# Altium footprint library TarabusLib_KOR.PcbLib: 560 footprints (part 6 of 35)
Each footprint in its own frame and in the unit in brackets; x right, y up, seen from the top. Pads: shape width x height; smd on the part's side, far side on the other; paste and mask are expansions set on the pad; w line width, h text height; cw(c..) or ccw(c..) is an arc to the next point about the centre after c.
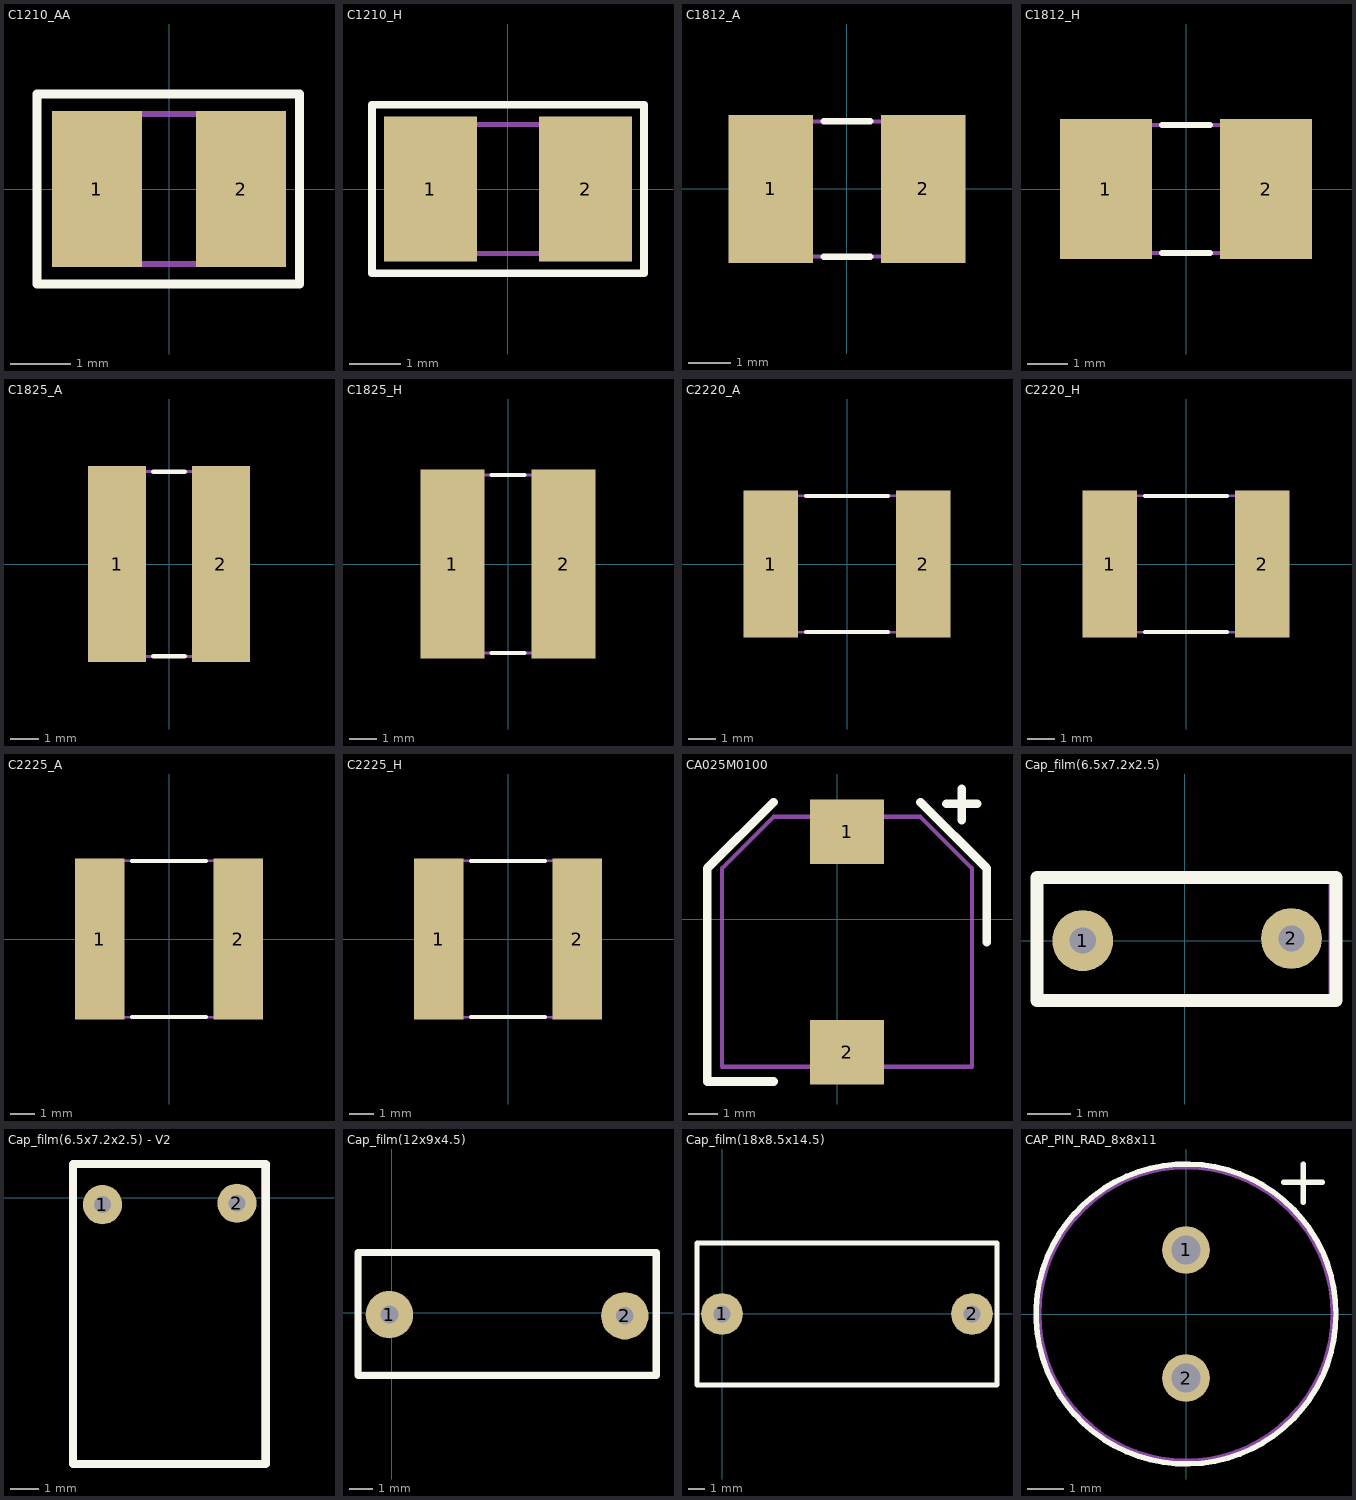
[diagram p5: the footprints below, top view; thin cyan lines are the x and y axes]

## C1210_AA [mm]
height 2.5
pads (2):
  rect 1.5x2.6 smd: 1(-1.2,0) 2(1.2,0)
Top Overlay:
  lines w0.15: -2.2,-1.58 -2.2,1.58 2.175,1.58 2.175,-1.58 -2.2,-1.58
Mechanical 7:
  lines w0.1: -1.6,-1.25 1.6,-1.25 1.6,1.25 -1.6,1.25 -1.6,-1.25
Mechanical 10:
  text ".Designator" at -0.71,1.89 h0.8
  text ".Comment" at -0.74,-2.23 h0.6
3D body: height 2.5, standoff 0, extent -1.6,-1.25 1.6,1.25

## C1210_H [mm]
height 2.5
pads (2):
  rect 1.8x2.8 smd: 1(-1.5,0) 2(1.5,0)
Top Overlay:
  lines w0.15: -2.63,-1.63 -2.63,1.63 2.63,1.63 2.63,-1.63 -2.63,-1.63
Mechanical 7:
  lines w0.1: -1.6,-1.25 1.6,-1.25 1.6,1.25 -1.6,1.25 -1.6,-1.25
Mechanical 10:
  text ".Designator" at -0.71,1.89 h0.8
  text ".Comment" at -0.69,-2.29 h0.6
3D body: height 2.5, standoff 0, extent -1.6,-1.25 1.6,1.25

## C1812_A [mm]
height 1.7
pads (2):
  rect 2x3.5 smd: 1(-1.8,0) 2(1.8,0)
Top Overlay:
  lines w0.15: -0.55,-1.6 0.55,-1.6 ; -0.55,1.6 0.55,1.6
Mechanical 7:
  lines w0.1: -2.25,-1.6 -2.25,1.6 2.25,1.6 2.25,-1.6 -2.25,-1.6
Mechanical 10:
  text ".Designator" at -0.62,2.14 h0.8
  text ".Comment" at -0.52,-2.51 h0.6
3D body: height 1.7, standoff 0, extent -2.25,-1.6 2.25,1.6

## C1812_H [mm]
height 1.7
pads (2):
  rect 2.3x3.5 smd: 1(-2,0) 2(2,0)
Top Overlay:
  lines w0.15: -0.6,-1.6 0.6,-1.6 ; -0.6,1.6 0.6,1.6
Mechanical 7:
  lines w0.1: -2.25,-1.6 -2.25,1.6 2.25,1.6 2.25,-1.6 -2.25,-1.6
Mechanical 10:
  text ".Comment" at -0.63,-2.52 h0.6
  text ".Designator" at -0.62,2.14 h0.8
3D body: height 1.7, standoff 0, extent -2.25,-1.6 2.25,1.6

## C1825_A [mm]
height 1.7
pads (2):
  rect 2x6.8 smd: 1(-1.8,0) 2(1.8,0)
Top Overlay:
  lines w0.15: -0.55,-3.2 0.55,-3.2 ; -0.55,3.2 0.55,3.2
Mechanical 7:
  lines w0.1: -2.25,-3.2 -2.25,3.2 2.25,3.2 2.25,-3.2 -2.25,-3.2
Mechanical 10:
  text ".Comment" at -0.58,-4.11 h0.6
  text ".Designator" at -0.69,3.88 h0.8
3D body: height 1.7, standoff 0, extent -2.25,-3.2 2.25,3.2

## C1825_H [mm]
height 1.7
pads (2):
  rect 2.3x6.8 smd: 1(-2,0) 2(2,0)
Top Overlay:
  lines w0.15: -0.6,-3.2 0.6,-3.2 ; -0.6,3.2 0.6,3.2
Mechanical 7:
  lines w0.1: -2.25,-3.2 -2.25,3.2 2.25,3.2 2.25,-3.2 -2.25,-3.2
Mechanical 10:
  text ".Comment" at -0.62,-4.23 h0.6
  text ".Designator" at -0.69,3.88 h0.8
3D body: height 1.7, standoff 0, extent -2.25,-3.2 2.25,3.2

## C2220_A [mm]
height 1.8
pads (2):
  rect 2x5.4 smd: 1(-2.8,0) 2(2.8,0)
Top Overlay:
  lines w0.15: -1.5,-2.5 1.5,-2.5 ; -1.5,2.5 1.5,2.5
Mechanical 7:
  lines w0.1: -2.8,-2.5 -2.8,2.5 2.8,2.5 2.8,-2.5 -2.8,-2.5
Mechanical 10:
  text ".Designator" at -0.56,3.04 h0.8
  text ".Comment" at -0.5,-3.49 h0.6
3D body: height 1.8, standoff 0, extent -2.8,-2.5 2.8,2.5

## C2220_H [mm]
height 1.8
pads (2):
  rect 2x5.4 smd: 1(-2.8,0) 2(2.8,0)
Top Overlay:
  lines w0.15: -1.5,-2.5 1.5,-2.5 ; -1.5,2.5 1.5,2.5
Mechanical 7:
  lines w0.1: -2.8,-2.5 -2.8,2.5 2.8,2.5 2.8,-2.5 -2.8,-2.5
Mechanical 10:
  text ".Designator" at -0.56,3.04 h0.8
  text ".Comment" at -0.47,-3.45 h0.6
3D body: height 1.8, standoff 0, extent -2.8,-2.5 2.8,2.5

## C2225_A [mm]
height 2
pads (2):
  rect 2x6.5 smd: 1(-2.8,0) 2(2.8,0)
Top Overlay:
  lines w0.15: -1.5,-3.15 1.5,-3.15 ; -1.5,3.15 1.5,3.15
Mechanical 7:
  lines w0.1: -2.8,-3.15 2.8,-3.15 2.8,3.15 -2.8,3.15 -2.8,-3.15
Mechanical 10:
  text ".Designator" at -0.59,3.58 h0.8
  text ".Comment" at -0.46,-4 h0.6
3D body: height 2, standoff 0, extent -2.8,-3.15 2.8,3.15

## C2225_H [mm]
height 2
pads (2):
  rect 2x6.5 smd: 1(-2.8,0) 2(2.8,0)
Top Overlay:
  lines w0.15: -1.5,-3.15 1.5,-3.15 ; -1.5,3.15 1.5,3.15
Mechanical 7:
  lines w0.1: -2.8,-3.15 -2.8,3.15 2.8,3.15 2.8,-3.15 -2.8,-3.15
Mechanical 10:
  text ".Designator" at -0.59,3.58 h0.8
  text ".Comment" at -0.42,-3.91 h0.6
3D body: height 2, standoff 0, extent -2.8,-3.15 2.8,3.15

## CA025M0100 [mm]
pads (2):
  rect 2.5x2.2 smd: 1(0.325,2.975) 2(0.325,-4.525)
Top Overlay:
  lines w0.3: -2.175,-5.525 -4.425,-5.525 -4.425,-5.025 -4.425,1.725 -2.175,3.975 ; 2.825,3.975 5.075,1.725 5.075,-0.775 ; 3.7,3.925 4.75,3.925 ; 4.225,3.375 4.225,4.425
Mechanical 7:
  lines w0.15: -3.925,-5.025 4.575,-5.025 4.575,1.725 2.825,3.475 -2.175,3.475 -3.925,1.725 -3.925,-5.025
3D body "CA025M0100REE-0806.STEP": height 6.5, standoff 0, extent -3.925,-5.175 4.375,3.425

## Cap_film(6.5x7.2x2.5) [mm] "6.5x7.2x2.5"
height 14.5
pads (2):
  round 1.4 hole 0.6: 1(-2.35,0) 2(2.45,0.05)
Top Overlay:
  lines w0.3: -3.4,-1.375 -3.4,1.45 3.475,1.45 3.475,-1.375 -3.4,-1.375
Mechanical 9:
  text ".Designator" at -1.35,-2.275 h0.7
  text ".Comment" at -1.025,1.825 h0.7
Mechanical 11:
  lines w0.15: -3.425,-1.35 -3.425,1.45 3.375,1.45 3.375,-1.35 -3.425,-1.35
3D body "К73-17 имп, 0.033 мкФ, 63 В, 5%, POLYESTER BOXED, B32529C0333J000, Конденсатор металлоплёночный.STEP": height 7.2, standoff -4.8, extent -3.25,-1.225 3.25,1.275

## Cap_film(6.5x7.2x2.5) - V2 [mm] "6.5x7.2x2.5"
height 14.5
pads (2):
  round 1.4 hole 0.6: 1(5.15,-0.25) 2(9.95,-0.2)
Top Overlay:
  lines w0.3: 4.1,-9.5 4.1,1.2 10.975,1.2 10.975,-9.5 4.1,-9.5
Mechanical 9:
  text ".Comment" at 6.875,-2.475 h0.7
  text ".Designator" at 6.55,-6.575 h0.7
Mechanical 11:
  lines w0.15: 4.075,-9.5 4.075,1.2 10.875,1.2 10.875,-9.5 4.075,-9.5
3D body "К73-17 имп, 0.033 мкФ, 63 В, 5%, POLYESTER BOXED, B32529C0333J000, Конденсатор металлоплёночный_1.STEP": height 2.5, standoff -2.75, extent 4.25,-9.25 10.75,0

## Cap_film(12x9x4.5) [mm] "12x9x4.5"
height 14.5
pads (2):
  round 2 hole 0.75: 1(-0.1,-0.075) 2(9.825,-0.125)
Top Overlay:
  lines w0.3: -1.425,-2.65 11.15,-2.65 11.15,2.55 -1.425,2.55 -1.425,-2.65
Mechanical 7:
  lines w0.15: -1.35,-2.55 -1.35,2.5 11.225,2.5 11.225,-2.55 -1.35,-2.55
3D body "К73-9, 0.027 мкФ, 100 В, 10-20%, Конденсатор металлоплёночный.STEP": height 12, standoff -3, extent -1.15,-2.35 10.85,2.15

## Cap_film(18x8.5x14.5) [mm] "18x8.5x14.5"
height 14.5
pads (2):
  round 2.5 hole 1: 1(0,0) 2(15,0)
Top Overlay:
  lines w0.3: -1.5,-4.25 16.5,-4.25 16.5,4.25 -1.5,4.25 -1.5,-4.25
Mechanical 7:
  lines w0.15: -1.5,-4.25 -1.5,4.25 16.5,4.25 16.5,-4.25 -1.5,-4.25
3D body "User Library-CAP_POLY_15mm.step": height 16.3, standoff -3.7, extent -2,-4 17,4

## CAP_PIN_RAD_8x8x11 [mm]
pads (2):
  round 1.3 hole 0.8: 1(0,1.75) 2(0,-1.75)
Top Overlay:
  circle w0.15: c0,0 r4.1
  lines w0.15: 2.675,3.6 3.725,3.6 ; 3.2,3.05 3.2,4.1
Mechanical 7:
  circle w0.1: c0,0 r4
Mechanical 9:
  circle w0.1: c0,0 r4
Mechanical 10:
  text ".Comment" at 1,-4.75 h0.6
  text ".Designator" at 0.75,4.75 h0.8
3D body: height 12, standoff 0.5, extent -3.968,-3.992 4,3.992